# Altium footprint library Active.PcbLib: 325 footprints (part 14 of 23)
Each footprint in its own frame and in the unit in brackets; x right, y up, seen from the top. Pads: shape width x height; smd on the part's side, far side on the other; paste and mask are expansions set on the pad; w line width, h text height; cw(c..) or ccw(c..) is an arc to the next point about the centre after c.
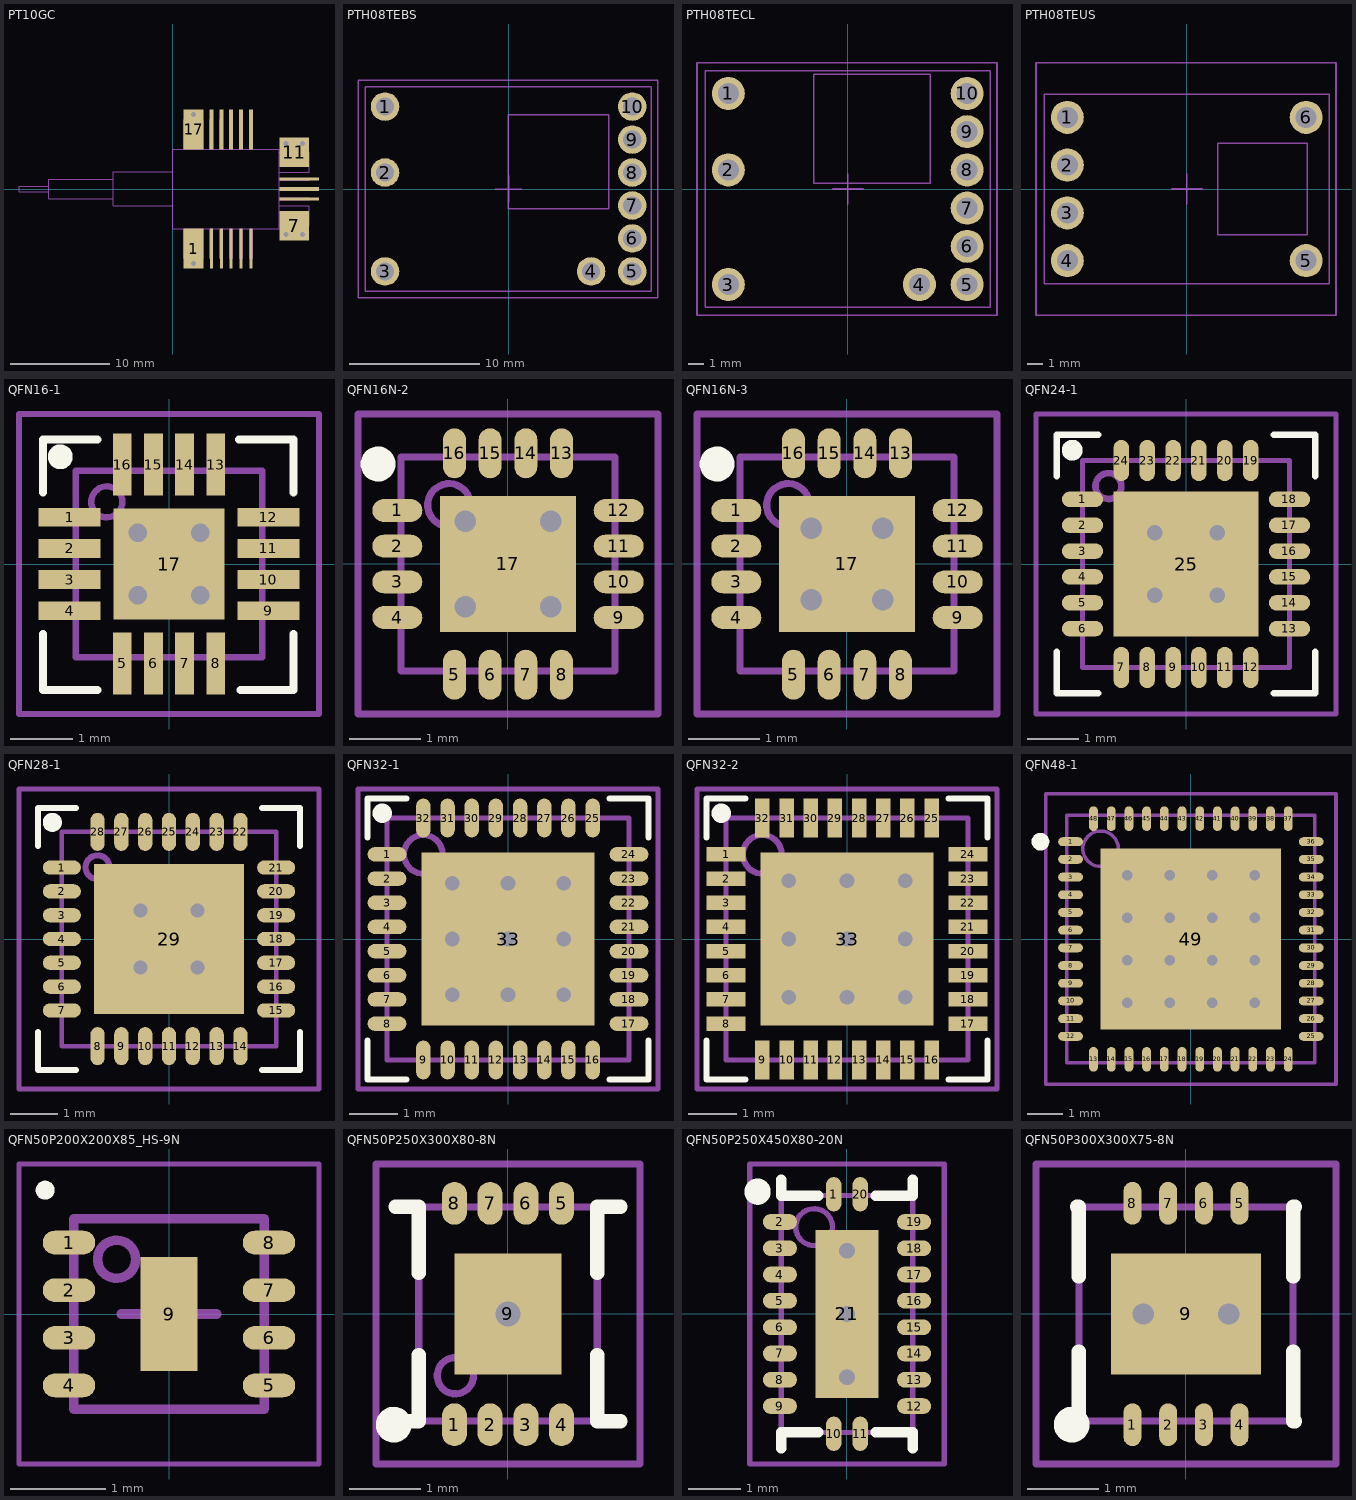
[diagram p13: the footprints below, top view; thin cyan lines are the x and y axes]

## PT10GC [mm] "10Gb/s PIN Preamp Receiver PT10GC"
height 4
pads (17):
  rect 2x4 smd paste-5: 1(2.1,-6) 17(2.1,6)
  rect 0.3x4 smd paste-5: 2(3.9,-6) 3(4.9,-6) 4(5.9,-6) 5(6.9,-6) 6(7.9,-6)
  rect 3x3 smd paste-5: 7(12.25,-3.7) 11(12.25,3.7)
  rect 4x0.3 smd paste-5: 8(12.75,-1) 10(12.75,1)
  rect 4x0.4 smd paste-5: 9(12.75,0)
  rect 0.4x4 smd paste-5: 12(7.9,6) 13(6.9,6) 14(5.9,6) 15(4.9,6) 16(3.9,6)
via 2.1,7.5 diameter 1 hole 0.5
via 2.1,-7.5 diameter 1 hole 0.5
via 11.4,4.6 diameter 1 hole 0.5
via 13.1,4.6 diameter 1 hole 0.5
via 13.1,-4.6 diameter 1 hole 0.5
via 11.4,-4.6 diameter 1 hole 0.5
Mechanical 13:
  lines w0.1: -12.5,-0.3 -15.5,-0.3 -15.5,0.3 -12.5,0.3 ; 1.1,-4 1.1,-7 3.1,-7 3.1,-4 ; 1.1,4 1.1,7 3.1,7 3.1,4 ; 3.75,-4 3.75,-7 4.05,-7 4.05,-4 ; 3.75,4 3.75,7 4.05,7 4.05,4 ; 4.75,-4 4.75,-7 5.05,-7 5.05,-4 ; 4.75,4 4.75,7 5.05,7 5.05,4 ; 5.75,-4 5.75,-7 6.05,-7 6.05,-4 ; 5.75,4 5.75,7 6.05,7 6.05,4 ; 6.75,-4 6.75,-7 7.05,-7 7.05,-4 ; 6.75,4 6.75,7 7.05,7 7.05,4 ; 7.75,-4 7.75,-7 8.05,-7 8.05,-4 ; 7.75,4 7.75,7 8.05,7 8.05,4 ; 10.75,-3.7 13.75,-3.7 13.75,-1.7 10.75,-1.7 ; 10.75,-1.1 13.75,-1.1 13.75,-0.9 10.75,-0.9 ; 10.75,-0.15 13.75,-0.15 13.75,0.15 10.75,0.15 ; 10.75,0.9 13.75,0.9 13.75,1.1 10.75,1.1 ; 10.75,1.7 13.75,1.7 13.75,3.7 10.75,3.7
  lines w0.102: -6,-0.996 -12.5,-0.996 -12.5,0.996 -6,0.996 ; -0.057,1.743 -6,1.743 -6,-1.7 0,-1.7 ; 0,-4 10.75,-4 10.75,4 0,4 0,-4
3D body: height 4, standoff 0.25, extent 0,-4 10.75,4
3D body: height 3.55, standoff 0.05, extent -6,-1.743 0,1.743
3D body: height 2.8, standoff 0.8, extent -12.5,-0.996 -6,0.996
3D body: height 2.1, standoff 1.5, extent -15.5,-0.299 -12.5,0.299
3D body: height 0.25, standoff 0, extent 0,-7 13.75,7
3D body: height 0.25, standoff 0, extent 3.1,-4 7.75,-3.6
3D body: height 0.25, standoff 0, extent 3.1,3.6 7.75,4
3D body: height 0.2, standoff 0, extent 3.75,-7 4.05,-4
3D body: height 0.2, standoff 0, extent 4.75,-7 5.05,-4
3D body: height 0.2, standoff 0, extent 5.75,-7 6.05,-4
3D body: height 0.2, standoff 0, extent 6.75,-7 7.05,-4
3D body: height 0.2, standoff 0, extent 7.75,-7 8.05,-4
3D body: height 0.2, standoff 0, extent 10.75,-0.15 13.75,0.15
3D body: height 0.2, standoff 0, extent 7.75,4 8.05,7
3D body: height 0.2, standoff 0, extent 6.75,4 7.05,7
3D body: height 0.2, standoff 0, extent 5.75,4 6.05,7
3D body: height 0.2, standoff 0, extent 4.75,4 5.05,7
3D body: height 0.2, standoff 0, extent 3.75,4 4.05,7
3D body: height 0.25, standoff 0, extent 10.35,-1.7 10.75,1.7
3D body: height 0.2, standoff 0, extent 10.75,-1.1 13.75,-0.9
3D body: height 0.2, standoff 0, extent 10.75,0.9 13.75,1.1

## PTH08TEBS [mm] "Power Module 19x16x8.5mm  THT"
height 8.5
pads (10):
  round 2.2 hole 1.4: 1(-9.525,6.35) 2(-9.525,1.27) 3(-9.525,-6.35) 4(6.35,-6.35) 5(9.525,-6.35) 6(9.525,-3.81) 7(9.525,-1.27) 8(9.525,1.27) 9(9.525,3.81) 10(9.525,6.35)
Mechanical 13:
  lines w0.102: -11.049,-7.874 -11.049,7.874 10.998,7.874 10.998,-7.874 -11.049,-7.874 ; -0.051,-1.524 7.696,-1.524 7.696,5.715 -0.051,5.715 -0.051,-1.524
Mechanical 15:
  lines w0.102: -1.016,0 1.016,0 ; 0,-1.016 0,1.016 ; -11.608,-8.382 -11.608,8.382 11.506,8.382 11.506,-8.382 -11.608,-8.382
3D body: height 1.8, standoff -3.55, extent 9.025,5.85 10.025,6.85
3D body: height 1.8, standoff -3.55, extent 9.025,3.31 10.025,4.31
3D body: height 1.8, standoff -3.55, extent 9.025,0.77 10.025,1.77
3D body: height 1.8, standoff -3.55, extent 9.025,-1.77 10.025,-0.77
3D body: height 1.8, standoff -3.55, extent 9.025,-4.31 10.025,-3.31
3D body: height 1.8, standoff -3.55, extent 9.025,-6.85 10.025,-5.85
3D body: height 1.8, standoff -3.55, extent 5.85,-6.85 6.85,-5.85
3D body: height 1.8, standoff -3.55, extent -10.025,-6.85 -9.025,-5.85
3D body: height 1.8, standoff -3.55, extent -10.025,0.77 -9.025,1.77
3D body: height 1.8, standoff -3.55, extent -10.025,5.85 -9.025,6.85
3D body: height 8.5, standoff 6, extent -0.051,-1.524 7.696,5.715
3D body: height 1.8, standoff 0.2, extent -10.719,-7.493 10.744,7.493
3D body: height 3.2, standoff 1.8, extent -11.049,-7.874 10.998,7.874
3D body: height 6, standoff 3.2, extent -10.846,-7.62 10.744,7.62

## PTH08TECL [mm] "Power Module 22x16x8.5mm  THT"
height 8.5
pads (10):
  round 2.2 hole 1.4: 1(-7.95,6.35) 2(-7.95,1.27) 3(-7.95,-6.35) 4(4.75,-6.35) 5(7.925,-6.35) 6(7.925,-3.81) 7(7.925,-1.27) 8(7.925,1.27) 9(7.925,3.81) 10(7.925,6.35)
Mechanical 13:
  lines w0.102: -9.474,-7.874 9.449,-7.874 9.449,7.874 -9.474,7.874 -9.474,-7.874 ; -2.286,0.381 -2.286,7.62 5.461,7.62 5.461,0.381 -2.286,0.381
Mechanical 15:
  lines w0.102: -1.016,0 1.016,0 ; 0,-1.016 0,1.016 ; -10.033,-8.382 9.906,-8.382 9.906,8.382 -10.033,8.382 -10.033,-8.382
3D body: height 6, standoff 3.2, extent -9.271,-7.62 9.144,7.62
3D body: height 3.2, standoff 1.8, extent -9.474,-7.874 9.449,7.874
3D body: height 1.8, standoff 0.2, extent -9.144,-7.493 9.144,7.493
3D body: height 8.5, standoff 6, extent -2.286,0.381 5.461,7.62
3D body: height 1.8, standoff -3.55, extent -8.45,5.85 -7.45,6.85
3D body: height 1.8, standoff -3.55, extent -8.45,0.77 -7.45,1.77
3D body: height 1.8, standoff -3.55, extent -8.45,-6.85 -7.45,-5.85
3D body: height 1.8, standoff -3.55, extent 4.25,-6.85 5.25,-5.85
3D body: height 1.8, standoff -3.55, extent 7.425,-6.85 8.425,-5.85
3D body: height 1.8, standoff -3.55, extent 7.425,-4.31 8.425,-3.31
3D body: height 1.8, standoff -3.55, extent 7.425,-1.77 8.425,-0.77
3D body: height 1.8, standoff -3.55, extent 7.425,0.77 8.425,1.77
3D body: height 1.8, standoff -3.55, extent 7.425,3.31 8.425,4.31
3D body: height 1.8, standoff -3.55, extent 7.425,5.85 8.425,6.85

## PTH08TEUS [mm] "Power Module EUS 19x13x8.5mm  THT"
height 8.5
pads (6):
  round 2.2 hole 1.4: 1(-7.95,4.763) 2(-7.95,1.587) 3(-7.95,-1.587) 4(-7.95,-4.763) 5(7.925,-4.763) 6(7.925,4.763)
Mechanical 13:
  lines w0.102: -9.474,-6.285 9.449,-6.285 9.449,6.285 -9.474,6.285 -9.474,-6.285 ; 2.032,-3.048 2.032,3.048 8.001,3.048 8.001,-3.048 2.032,-3.048
Mechanical 15:
  lines w0.102: -1.016,0 1.016,0 ; 0,-1.016 0,1.016 ; -10.033,-8.382 9.906,-8.382 9.906,8.382 -10.033,8.382 -10.033,-8.382
3D body: height 6, standoff 3.2, extent -9.271,-6.2 9.144,6.2
3D body: height 3.2, standoff 1.8, extent -9.474,-6.285 9.449,6.285
3D body: height 1.8, standoff 0.2, extent -9.144,-6.1 9.144,6.1
3D body: height 8.5, standoff 6, extent 2.032,-3.048 8.001,3.048
3D body: height 0, standoff -3.56, extent 7.421,4.268 8.433,5.282
3D body: height 0, standoff -3.56, extent 7.421,-5.257 8.433,-4.243
3D body: height 0, standoff -3.56, extent -8.454,-5.257 -7.442,-4.243
3D body: height 0, standoff -3.56, extent -8.454,-2.082 -7.442,-1.068
3D body: height 0, standoff -3.56, extent -8.454,1.093 -7.442,2.107
3D body: height 0, standoff -3.56, extent -8.454,4.268 -7.442,5.282

## QFN16-1 [mm] "QFN16; 16 Leads; Body Width 3.0 mm; Pitch 0.5 mm"
height 0.9
pads (17):
  rect 1x0.3 smd mask+0.051: 1(-1.6,0.75) 2(-1.6,0.25) 3(-1.6,-0.25) 4(-1.6,-0.75) 9(1.6,-0.75) 10(1.6,-0.25) 11(1.6,0.25) 12(1.6,0.75)
  rect 0.3x1 smd mask+0.051: 5(-0.75,-1.6) 6(-0.25,-1.6) 7(0.25,-1.6) 8(0.75,-1.6) 13(0.75,1.6) 14(0.25,1.6) 15(-0.25,1.6) 16(-0.75,1.6)
  rect 1.778x1.778 smd paste-5 mask-5: 17(0,0)
via -0.5,0.5 diameter 0.65 hole 0.3
via 0.5,0.5 diameter 0.65 hole 0.3
via 0.5,-0.5 diameter 0.65 hole 0.3
via -0.5,-0.5 diameter 0.65 hole 0.3
Top Overlay:
  circle w0.2: c-1.75,1.725 r0.1
  lines w0.127: -2.025,-1.125 -2.025,-2.025 -1.15,-2.025 ; -2.025,1.15 -2.025,2 -1.15,2 ; 1.125,2 2,2 2,1.15 ; 1.15,-2.025 2,-2.025 2,-1.125
Top Paste:
  region: -0.35,0.175 -0.175,0.35 -0.175,0.875 0.175,0.875 0.175,0.35 0.35,0.175 0.875,0.175 0.875,-0.175 0.35,-0.175 0.175,-0.35 0.175,-0.875 -0.175,-0.875 -0.175,-0.35 -0.35,-0.175 -0.875,-0.175 -0.875,0.175
Top Solder:
  region: -0.925,0.925 -0.5,0.925 -0.5,0.825 -0.532,0.825 -0.627,0.806 -0.734,0.734 -0.806,0.627 -0.825,0.532 -0.825,0.5 -0.825,0.468 -0.806,0.373 -0.734,0.266 -0.627,0.194 -0.532,0.175 -0.5,0.175 -0.468,0.175 -0.373,0.194 -0.266,0.266 -0.194,0.373 -0.175,0.468 -0.175,0.5 -0.175,0.532 -0.194,0.627 -0.266,0.734 -0.373,0.806 -0.468,0.825 -0.5,0.825 -0.5,0.925 0,0.925 0,0 -0.925,0
  region: -0.925,-0.925 -0.925,-0.5 -0.825,-0.5 -0.825,-0.532 -0.806,-0.627 -0.734,-0.734 -0.627,-0.806 -0.532,-0.825 -0.5,-0.825 -0.468,-0.825 -0.373,-0.806 -0.266,-0.734 -0.194,-0.627 -0.175,-0.532 -0.175,-0.5 -0.175,-0.468 -0.194,-0.373 -0.266,-0.266 -0.373,-0.194 -0.468,-0.175 -0.5,-0.175 -0.532,-0.175 -0.627,-0.194 -0.734,-0.266 -0.806,-0.373 -0.825,-0.468 -0.825,-0.5 -0.925,-0.5 -0.925,0 0,0 0,-0.925
  region: 0.925,-0.925 0.5,-0.925 0.5,-0.825 0.532,-0.825 0.627,-0.806 0.734,-0.734 0.806,-0.627 0.825,-0.532 0.825,-0.5 0.825,-0.468 0.806,-0.373 0.734,-0.266 0.627,-0.194 0.532,-0.175 0.5,-0.175 0.468,-0.175 0.373,-0.194 0.266,-0.266 0.194,-0.373 0.175,-0.468 0.175,-0.5 0.175,-0.532 0.194,-0.627 0.266,-0.734 0.373,-0.806 0.468,-0.825 0.5,-0.825 0.5,-0.925 0,-0.925 0,0 0.925,0
  region: 0.925,0.925 0.925,0.5 0.825,0.5 0.825,0.532 0.806,0.627 0.734,0.734 0.627,0.806 0.532,0.825 0.5,0.825 0.468,0.825 0.373,0.806 0.266,0.734 0.194,0.627 0.175,0.532 0.175,0.5 0.175,0.468 0.194,0.373 0.266,0.266 0.373,0.194 0.468,0.175 0.5,0.175 0.532,0.175 0.627,0.194 0.734,0.266 0.806,0.373 0.825,0.468 0.825,0.5 0.925,0.5 0.925,0 0,0 0,0.925
Mechanical 13:
  circle w0.102: c-1,1 r0.25
  lines w0.1: -1.5,-1.5 1.5,-1.5 1.5,1.5 -1.5,1.5 -1.5,-1.5
Mechanical 15:
  lines w0.1: -2.413,-2.413 2.413,-2.413 2.413,2.413 -2.413,2.413 -2.413,-2.413
  lines w0.102: -0.508,0 0.508,0 ; 0,-0.508 0,0.508
3D body: height 0.9, standoff 0, extent -1.5,-1.5 1.5,1.5

## QFN16N-2 [mm] "QFN, 16-Leads, Body 3,0x3,0mm (max), Pitch 0,50mm, IPC Medium Density"
height 1
pads (17):
  oval 0.7x0.32 smd mask+0.051: 1(-1.55,0.75) 2(-1.55,0.25) 3(-1.55,-0.25) 4(-1.55,-0.75) 9(1.55,-0.75) 10(1.55,-0.25) 11(1.55,0.25) 12(1.55,0.75)
  oval 0.32x0.7 smd mask+0.051: 5(-0.75,-1.55) 6(-0.25,-1.55) 7(0.25,-1.55) 8(0.75,-1.55) 13(0.75,1.55) 14(0.25,1.55) 15(-0.25,1.55) 16(-0.75,1.55)
  rect 1.9x1.9 smd paste-5 mask-5: 17(0,0)
via 0.6,-0.6 diameter 0.66 hole 0.3
via -0.6,-0.6 diameter 0.66 hole 0.3
via 0.6,0.6 diameter 0.66 hole 0.3
via -0.6,0.6 diameter 0.66 hole 0.3
Top Overlay:
  circle w0.25: c-1.82,1.4 r0.12
Top Paste:
  region: -0.275,0.95 -0.275,0.45 -0.45,0.275 -0.95,0.275 -0.95,-0.275 -0.45,-0.275 -0.275,-0.45 -0.275,-0.95 0.275,-0.95 0.275,-0.45 0.45,-0.275 0.95,-0.275 0.95,0.275 0.45,0.275 0.275,0.45 0.275,0.95
Top Solder:
  region: 1,1 1,0.6 0.925,0.6 0.925,0.632 0.906,0.727 0.834,0.834 0.727,0.906 0.632,0.925 0.6,0.925 0.568,0.925 0.473,0.906 0.366,0.834 0.294,0.727 0.275,0.632 0.275,0.6 0.275,0.568 0.294,0.473 0.366,0.366 0.473,0.294 0.568,0.275 0.6,0.275 0.632,0.275 0.727,0.294 0.834,0.366 0.906,0.473 0.925,0.568 0.925,0.6 1,0.6 1,0 0,0 0,1
  region: 1,-1 0.6,-1 0.6,-0.925 0.632,-0.925 0.727,-0.906 0.834,-0.834 0.906,-0.727 0.925,-0.632 0.925,-0.6 0.925,-0.568 0.906,-0.473 0.834,-0.366 0.727,-0.294 0.632,-0.275 0.6,-0.275 0.568,-0.275 0.473,-0.294 0.366,-0.366 0.294,-0.473 0.275,-0.568 0.275,-0.6 0.275,-0.632 0.294,-0.727 0.366,-0.834 0.473,-0.906 0.568,-0.925 0.6,-0.925 0.6,-1 0,-1 0,0 1,0
  region: -1,-1 -1,-0.6 -0.925,-0.6 -0.925,-0.632 -0.906,-0.727 -0.834,-0.834 -0.727,-0.906 -0.632,-0.925 -0.6,-0.925 -0.568,-0.925 -0.473,-0.906 -0.366,-0.834 -0.294,-0.727 -0.275,-0.632 -0.275,-0.6 -0.275,-0.568 -0.294,-0.473 -0.366,-0.366 -0.473,-0.294 -0.568,-0.275 -0.6,-0.275 -0.632,-0.275 -0.727,-0.294 -0.834,-0.366 -0.906,-0.473 -0.925,-0.568 -0.925,-0.6 -1,-0.6 -1,0 0,0 0,-1
  region: -1,1 -0.6,1 -0.6,0.925 -0.632,0.925 -0.727,0.906 -0.834,0.834 -0.906,0.727 -0.925,0.632 -0.925,0.6 -0.925,0.568 -0.906,0.473 -0.834,0.366 -0.727,0.294 -0.632,0.275 -0.6,0.275 -0.568,0.275 -0.473,0.294 -0.366,0.366 -0.294,0.473 -0.275,0.568 -0.275,0.6 -0.275,0.632 -0.294,0.727 -0.366,0.834 -0.473,0.906 -0.568,0.925 -0.6,0.925 -0.6,1 0,1 0,0 -1,0
Mechanical 13:
  circle w0.1: c-0.825,0.825 r0.3
  lines w0.1: -1.5,-1.5 1.5,-1.5 1.5,1.5 -1.5,1.5 -1.5,-1.5
Mechanical 15:
  lines w0.1: -0.5,0 0.5,0 ; 0,-0.5 0,0.5 ; -2.1,-2.1 2.1,-2.1 2.1,2.1 -2.1,2.1 -2.1,-2.1
3D body: height 1, standoff 0.02, extent -1.5,-1.5 1.5,1.5
3D body: height 1.01, standoff 1, extent -1.225,0.425 -0.425,1.225

## QFN16N-3 [mm] "QFN, 16-Leads, Body 3,0x3,0mm (max), Pitch 0,50mm, IPC Medium Density"
height 1
pads (17):
  oval 0.7x0.32 smd mask+0.051: 1(-1.55,0.75) 2(-1.55,0.25) 3(-1.55,-0.25) 4(-1.55,-0.75) 9(1.55,-0.75) 10(1.55,-0.25) 11(1.55,0.25) 12(1.55,0.75)
  oval 0.32x0.7 smd mask+0.051: 5(-0.75,-1.55) 6(-0.25,-1.55) 7(0.25,-1.55) 8(0.75,-1.55) 13(0.75,1.55) 14(0.25,1.55) 15(-0.25,1.55) 16(-0.75,1.55)
  rect 1.9x1.9 smd paste-5 mask-5: 17(0,0)
via -0.5,0.5 diameter 0.65 hole 0.3
via -0.5,-0.5 diameter 0.65 hole 0.3
via 0.5,-0.5 diameter 0.65 hole 0.3
via 0.5,0.5 diameter 0.65 hole 0.3
Top Overlay:
  circle w0.25: c-1.82,1.4 r0.12
Top Paste:
  region: 0.65,-0.95 0.65,-0.825 0.825,-0.65 0.95,-0.65 0.95,-0.95
  region: 0.95,0.65 0.825,0.65 0.65,0.825 0.65,0.95 0.95,0.95
  region: -0.65,0.95 -0.65,0.825 -0.825,0.65 -0.95,0.65 -0.95,0.95
  region: -0.95,-0.65 -0.825,-0.65 -0.65,-0.825 -0.65,-0.95 -0.95,-0.95
  region: 0.175,-0.65 0.35,-0.825 0.35,-0.95 -0.35,-0.95 -0.35,-0.825 -0.175,-0.65
  region: -0.65,-0.175 -0.825,-0.35 -0.95,-0.35 -0.95,0.35 -0.825,0.35 -0.65,0.175
  region: -0.175,0.65 -0.35,0.825 -0.35,0.95 0.35,0.95 0.35,0.825 0.175,0.65
  region: 0.65,0.175 0.825,0.35 0.95,0.35 0.95,-0.35 0.825,-0.35 0.65,-0.175
  region: -0.175,0.35 0.175,0.35 0.35,0.175 0.35,-0.175 0.175,-0.35 -0.175,-0.35 -0.35,-0.175 -0.35,0.175
Top Solder:
  region: -0.975,0.975 -0.5,0.975 -0.5,0.825 -0.532,0.825 -0.627,0.806 -0.734,0.734 -0.806,0.627 -0.825,0.532 -0.825,0.5 -0.825,0.468 -0.806,0.373 -0.734,0.266 -0.627,0.194 -0.532,0.175 -0.5,0.175 -0.5,-0.175 -0.532,-0.175 -0.627,-0.194 -0.734,-0.266 -0.806,-0.373 -0.825,-0.468 -0.825,-0.5 -0.825,-0.532 -0.806,-0.627 -0.734,-0.734 -0.627,-0.806 -0.532,-0.825 -0.5,-0.825 -0.468,-0.825 -0.373,-0.806 -0.266,-0.734 -0.194,-0.627 -0.175,-0.532 -0.175,-0.5 0.175,-0.5 0.175,-0.532 0.194,-0.627 0.266,-0.734 0.373,-0.806 0.468,-0.825 0.5,-0.825 0.532,-0.825 0.627,-0.806 0.734,-0.734 0.806,-0.627 0.825,-0.532 0.825,-0.5 0.825,-0.468 0.806,-0.373 0.734,-0.266 0.627,-0.194 0.532,-0.175 0.5,-0.175 0.5,0.175 0.532,0.175 0.627,0.194 0.734,0.266 0.806,0.373 0.825,0.468 0.825,0.5 0.825,0.532 0.806,0.627 0.734,0.734 0.627,0.806 0.532,0.825 0.5,0.825 0.468,0.825 0.373,0.806 0.266,0.734 0.194,0.627 0.175,0.532 0.175,0.5 0.175,0.468 0.194,0.373 0.266,0.266 0.373,0.194 0.468,0.175 0.5,0.175 0.5,-0.175 0.468,-0.175 0.373,-0.194 0.266,-0.266 0.194,-0.373 0.175,-0.468 0.175,-0.5 -0.175,-0.5 -0.175,-0.468 -0.194,-0.373 -0.266,-0.266 -0.373,-0.194 -0.468,-0.175 -0.5,-0.175 -0.5,0.175 -0.468,0.175 -0.373,0.194 -0.266,0.266 -0.194,0.373 -0.175,0.468 -0.175,0.5 -0.175,0.532 -0.194,0.627 -0.266,0.734 -0.373,0.806 -0.468,0.825 -0.5,0.825 -0.5,0.975 0.975,0.975 0.975,-0.975 -0.975,-0.975
Mechanical 13:
  circle w0.1: c-0.825,0.825 r0.3
  lines w0.1: -1.5,-1.5 -1.5,1.5 1.5,1.5 1.5,-1.5 -1.5,-1.5
Mechanical 15:
  lines w0.1: -0.5,0 0.5,0 ; 0,-0.5 0,0.5 ; -2.1,-2.1 -2.1,2.1 2.1,2.1 2.1,-2.1 -2.1,-2.1
3D body: height 1, standoff 0.02, extent -1.5,-1.5 1.5,1.5
3D body: height 1.01, standoff 1, extent -1.225,0.425 -0.425,1.225

## QFN24-1 [mm] "QFN24; 24 Leads; Body Width 4.0 mm; Pitch 0.5 mm"
height 0.9
pads (25):
  oval 0.8x0.3 smd mask+0.025: 1(-2,1.25) 2(-2,0.75) 3(-2,0.25) 4(-2,-0.25) 5(-2,-0.75) 6(-2,-1.25) 13(2,-1.25) 14(2,-0.75) 15(2,-0.25) 16(2,0.25) 17(2,0.75) 18(2,1.25)
  oval 0.3x0.8 smd mask+0.025: 7(-1.25,-2) 8(-0.75,-2) 9(-0.25,-2) 10(0.25,-2) 11(0.75,-2) 12(1.25,-2) 19(1.25,2) 20(0.75,2) 21(0.25,2) 22(-0.25,2) 23(-0.75,2) 24(-1.25,2)
  rect 2.8x2.8 smd paste-2.54 mask-2.54: 25(0,0)
via -0.6,-0.6 diameter 0.6 hole 0.3
via -0.6,0.6 diameter 0.6 hole 0.3
via 0.6,0.6 diameter 0.6 hole 0.3
via 0.6,-0.6 diameter 0.6 hole 0.3
Top Overlay:
  circle w0.2: c-2.2,2.2 r0.1
  lines w0.127: -2.5,-1.7 -2.5,-2.5 -1.7,-2.5 ; -2.5,1.7 -2.5,2.5 -1.7,2.5 ; 1.7,-2.5 2.5,-2.5 2.5,-1.7 ; 1.7,2.5 2.5,2.5 2.5,1.7
Top Paste:
  region: -0.45,1.3 -0.45,0.95 -0.25,0.75 0.25,0.75 0.45,0.95 0.45,1.3
  region: 1.3,0.45 0.95,0.45 0.75,0.25 0.75,-0.25 0.95,-0.45 1.3,-0.45
  region: -1.3,1.3 -0.725,1.3 -0.725,0.975 -0.95,0.75 -1.3,0.75
  region: 1.3,-1.3 0.725,-1.3 0.725,-0.975 0.95,-0.75 1.3,-0.75
  region: 1.3,1.3 1.3,0.725 0.975,0.725 0.75,0.95 0.75,1.3
  region: 0.45,-1.3 0.45,-0.95 0.25,-0.75 -0.25,-0.75 -0.45,-0.95 -0.45,-1.3
  region: -1.3,-0.45 -0.95,-0.45 -0.75,-0.25 -0.75,0.25 -0.95,0.45 -1.3,0.45
  region: -0.45,-0.25 -0.25,-0.45 0.25,-0.45 0.45,-0.25 0.45,0.25 0.25,0.45 -0.25,0.45 -0.45,0.25
  region: -1.3,-1.3 -1.3,-0.725 -0.975,-0.725 -0.75,-0.95 -0.75,-1.3
Top Solder:
  region: -1.4,1.4 -0.6,1.4 -0.6,0.9 -0.63,0.9 -0.717,0.883 -0.816,0.816 -0.883,0.717 -0.9,0.63 -0.9,0.6 -0.9,0.57 -0.883,0.483 -0.816,0.384 -0.717,0.317 -0.63,0.3 -0.6,0.3 -0.57,0.3 -0.483,0.317 -0.384,0.384 -0.317,0.483 -0.3,0.57 -0.3,0.6 -0.3,0.63 -0.317,0.717 -0.384,0.816 -0.483,0.883 -0.57,0.9 -0.6,0.9 -0.6,1.4 0.6,1.4 0.6,0.9 0.57,0.9 0.483,0.883 0.384,0.816 0.317,0.717 0.3,0.63 0.3,0.6 0.3,0.57 0.317,0.483 0.384,0.384 0.483,0.317 0.57,0.3 0.6,0.3 0.63,0.3 0.717,0.317 0.816,0.384 0.883,0.483 0.9,0.57 0.9,0.6 0.9,0.63 0.883,0.717 0.816,0.816 0.717,0.883 0.63,0.9 0.6,0.9 0.6,1.4 1.4,1.4 1.4,-0.6 0.9,-0.6 0.9,-0.57 0.883,-0.483 0.816,-0.384 0.717,-0.317 0.63,-0.3 0.6,-0.3 0.57,-0.3 0.483,-0.317 0.384,-0.384 0.317,-0.483 0.3,-0.57 0.3,-0.6 0.3,-0.63 0.317,-0.717 0.384,-0.816 0.483,-0.883 0.57,-0.9 0.6,-0.9 0.63,-0.9 0.717,-0.883 0.816,-0.816 0.883,-0.717 0.9,-0.63 0.9,-0.6 1.4,-0.6 1.4,-1.4 -0.6,-1.4 -0.6,-0.9 -0.57,-0.9 -0.483,-0.883 -0.384,-0.816 -0.317,-0.717 -0.3,-0.63 -0.3,-0.6 -0.3,-0.57 -0.317,-0.483 -0.384,-0.384 -0.483,-0.317 -0.57,-0.3 -0.6,-0.3 -0.63,-0.3 -0.717,-0.317 -0.816,-0.384 -0.883,-0.483 -0.9,-0.57 -0.9,-0.6 -0.9,-0.63 -0.883,-0.717 -0.816,-0.816 -0.717,-0.883 -0.63,-0.9 -0.6,-0.9 -0.6,-1.4 -1.4,-1.4
Mechanical 13:
  circle w0.127: c-1.5,1.506 r0.25
  lines w0.1: -2,-2 -2,2 2,2 2,-2 -2,-2
Mechanical 15:
  lines w0.102: -1.016,0 1.016,0 ; 0,-1.016 0,1.016 ; -2.9,-2.9 2.9,-2.9 2.9,2.9 -2.9,2.9 -2.9,-2.9
3D body: height 0.9, standoff 0, extent -2,-2 2,2
3D body: height 0.9, standoff 0.9, extent -1.753,1.245 -1.25,1.753

## QFN28-1 [mm] "QFN28; 28 Leads; Body Width 5.0 mm; Pitch 0.5 mm"
height 0.9
pads (29):
  oval 0.8x0.3 smd mask+0.038: 1(-2.25,1.5) 2(-2.25,1) 3(-2.25,0.5) 4(-2.25,0) 5(-2.25,-0.5) 6(-2.25,-1) 7(-2.25,-1.5) 15(2.25,-1.5) 16(2.25,-1) 17(2.25,-0.5) 18(2.25,0) 19(2.25,0.5) 20(2.25,1) 21(2.25,1.5)
  oval 0.3x0.8 smd mask+0.038: 8(-1.5,-2.25) 9(-1,-2.25) 10(-0.5,-2.25) 11(0,-2.25) 12(0.5,-2.25) 13(1,-2.25) 14(1.5,-2.25) 22(1.5,2.25) 23(1,2.25) 24(0.5,2.25) 25(0,2.25) 26(-0.5,2.25) 27(-1,2.25) 28(-1.5,2.25)
  rect 3.15x3.15 smd paste-1.6 mask-1.6: 29(0,0)
via 0.6,-0.6 diameter 0.65 hole 0.3
via 0.6,0.6 diameter 0.65 hole 0.3
via -0.6,-0.6 diameter 0.65 hole 0.3
via -0.6,0.6 diameter 0.65 hole 0.3
Top Overlay:
  circle w0.2: c-2.45,2.45 r0.1
  lines w0.127: -2.75,-1.95 -2.75,-2.75 -1.95,-2.75 ; -2.75,1.95 -2.75,2.75 -1.95,2.75 ; 1.95,-2.75 2.75,-2.75 2.75,-1.95 ; 1.95,2.75 2.75,2.75 2.75,1.95
Top Paste:
  region: -0.2,0.45 -0.45,0.2 -0.45,-0.2 -0.2,-0.45 0.2,-0.45 0.45,-0.2 0.45,0.2 0.2,0.45
  region: 0.45,1.475 -0.45,1.475 -0.45,1 -0.2,0.75 0.2,0.75 0.45,1
  region: 1.475,-0.45 1.475,0.45 1,0.45 0.75,0.2 0.75,-0.2 1,-0.45
  region: -1.475,0.45 -1.475,-0.45 -1,-0.45 -0.75,-0.2 -0.75,0.2 -1,0.45
  region: -0.45,-1.475 0.45,-1.475 0.45,-1 0.2,-0.75 -0.2,-0.75 -0.45,-1
  region: -1.475,-0.75 -1.475,-1.475 -0.75,-1.475 -0.75,-1 -1,-0.75
  region: 0.75,-1.475 1.475,-1.475 1.475,-0.75 1,-0.75 0.75,-1
  region: 1.475,0.75 1.475,1.475 0.75,1.475 0.75,1 1,0.75
  region: -0.75,1.475 -1.475,1.475 -1.475,0.75 -1,0.75 -0.75,1
Top Solder:
  region: 1.6,1.6 1.6,0.6 0.9,0.6 0.9,0.63 0.883,0.717 0.816,0.816 0.717,0.883 0.63,0.9 0.6,0.9 0.57,0.9 0.483,0.883 0.384,0.816 0.317,0.717 0.3,0.63 0.3,0.6 0.3,0.57 0.317,0.483 0.384,0.384 0.483,0.317 0.57,0.3 0.6,0.3 0.63,0.3 0.717,0.317 0.816,0.384 0.883,0.483 0.9,0.57 0.9,0.6 1.6,0.6 1.6,-0.6 0.9,-0.6 0.9,-0.57 0.883,-0.483 0.816,-0.384 0.717,-0.317 0.63,-0.3 0.6,-0.3 0.57,-0.3 0.483,-0.317 0.384,-0.384 0.317,-0.483 0.3,-0.57 0.3,-0.6 0.3,-0.63 0.317,-0.717 0.384,-0.816 0.483,-0.883 0.57,-0.9 0.6,-0.9 0.63,-0.9 0.717,-0.883 0.816,-0.816 0.883,-0.717 0.9,-0.63 0.9,-0.6 1.6,-0.6 1.6,-1.6 -1.6,-1.6 -1.6,-0.6 -0.9,-0.6 -0.9,-0.63 -0.883,-0.717 -0.816,-0.816 -0.717,-0.883 -0.63,-0.9 -0.6,-0.9 -0.57,-0.9 -0.483,-0.883 -0.384,-0.816 -0.317,-0.717 -0.3,-0.63 -0.3,-0.6 -0.3,-0.57 -0.317,-0.483 -0.384,-0.384 -0.483,-0.317 -0.57,-0.3 -0.6,-0.3 -0.63,-0.3 -0.717,-0.317 -0.816,-0.384 -0.883,-0.483 -0.9,-0.57 -0.9,-0.6 -1.6,-0.6 -1.6,0.6 -0.9,0.6 -0.9,0.57 -0.883,0.483 -0.816,0.384 -0.717,0.317 -0.63,0.3 -0.6,0.3 -0.57,0.3 -0.483,0.317 -0.384,0.384 -0.317,0.483 -0.3,0.57 -0.3,0.6 -0.3,0.63 -0.317,0.717 -0.384,0.816 -0.483,0.883 -0.57,0.9 -0.6,0.9 -0.63,0.9 -0.717,0.883 -0.816,0.816 -0.883,0.717 -0.9,0.63 -0.9,0.6 -1.6,0.6 -1.6,1.6
Mechanical 13:
  circle w0.127: c-1.5,1.506 r0.25
  lines w0.1: -2.25,-2.25 2.25,-2.25 2.25,2.25 -2.25,2.25 -2.25,-2.25
Mechanical 15:
  lines w0.102: -1.016,0 1.016,0 ; 0,-1.016 0,1.016 ; -3.15,-3.15 -3.15,3.15 3.15,3.15 3.15,-3.15 -3.15,-3.15
3D body: height 0.9, standoff 0.9, extent -1.753,1.245 -1.25,1.753
3D body: height 0.9, standoff 0, extent -2,-2 2,2

## QFN32-1 [mm] "QFN32  W32pin 5.0x5.0mm H0.9mm R0.5 mm PP3.5x3.5mm"
height 0.9
pads (33):
  oval 0.8x0.3 smd mask+0.038: 1(-2.5,1.75) 2(-2.5,1.25) 3(-2.5,0.75) 4(-2.5,0.25) 5(-2.5,-0.25) 6(-2.5,-0.75) 7(-2.5,-1.25) 8(-2.5,-1.75) 17(2.5,-1.75) 18(2.5,-1.25) 19(2.5,-0.75) 20(2.5,-0.25) 21(2.5,0.25) 22(2.5,0.75) 23(2.5,1.25) 24(2.5,1.75)
  oval 0.3x0.8 smd mask+0.038: 9(-1.75,-2.5) 10(-1.25,-2.5) 11(-0.75,-2.5) 12(-0.25,-2.5) 13(0.25,-2.5) 14(0.75,-2.5) 15(1.25,-2.5) 16(1.75,-2.5) 25(1.75,2.5) 26(1.25,2.5) 27(0.75,2.5) 28(0.25,2.5) 29(-0.25,2.5) 30(-0.75,2.5) 31(-1.25,2.5) 32(-1.75,2.5)
  rect 3.58x3.58 smd paste-5 mask-5: 33(0,0)
via -1.15,1.15 diameter 0.6 hole 0.3
via 0,1.15 diameter 0.6 hole 0.3
via 1.15,1.15 diameter 0.6 hole 0.3
via 1.15,-1.15 diameter 0.6 hole 0.3
via -1.15,-1.15 diameter 0.6 hole 0.3
via 0,-1.15 diameter 0.6 hole 0.3
via 1.15,0 diameter 0.6 hole 0.3
via -1.15,0 diameter 0.6 hole 0.3
via 0,0 diameter 0.6 hole 0.3
Top Overlay:
  circle w0.2: c-2.6,2.6 r0.1
  lines w0.127: -2.9,-2.1 -2.9,-2.9 -2.1,-2.9 ; -2.9,2.1 -2.9,2.9 -2.1,2.9 ; 2.1,-2.9 2.9,-2.9 2.9,-2.1 ; 2.1,2.9 2.9,2.9 2.9,2.1
Top Paste:
  region: -1,0.85 -0.85,1 -0.3,1 -0.15,0.85 -0.15,0.3 -0.3,0.15 -0.85,0.15 -1,0.3
  region: -0.85,-1 -1,-0.85 -1,-0.3 -0.85,-0.15 -0.3,-0.15 -0.15,-0.3 -0.15,-0.85 -0.3,-1
  region: 1,-0.85 0.85,-1 0.3,-1 0.15,-0.85 0.15,-0.3 0.3,-0.15 0.85,-0.15 1,-0.3
  region: 0.85,1 1,0.85 1,0.3 0.85,0.15 0.3,0.15 0.15,0.3 0.15,0.85 0.3,1
  region: -1.75,1 -1.45,1 -1.3,0.85 -1.3,0.3 -1.45,0.15 -1.75,0.15
  region: -1.75,-0.15 -1.45,-0.15 -1.3,-0.3 -1.3,-0.85 -1.45,-1 -1.75,-1
  region: -1,-1.75 -1,-1.45 -0.85,-1.3 -0.3,-1.3 -0.15,-1.45 -0.15,-1.75
  region: 0.15,-1.75 0.15,-1.45 0.3,-1.3 0.85,-1.3 1,-1.45 1,-1.75
  region: 1.75,-1 1.45,-1 1.3,-0.85 1.3,-0.3 1.45,-0.15 1.75,-0.15
  region: 1.75,0.15 1.45,0.15 1.3,0.3 1.3,0.85 1.45,1 1.75,1
  region: 1,1.75 1,1.45 0.85,1.3 0.3,1.3 0.15,1.45 0.15,1.75
  region: -0.15,1.75 -0.15,1.45 -0.3,1.3 -0.85,1.3 -1,1.45 -1,1.75
  region: 1.75,1.75 1.75,1.3 1.45,1.3 1.3,1.45 1.3,1.75
  region: -1.75,1.75 -1.3,1.75 -1.3,1.45 -1.45,1.3 -1.75,1.3
  region: -1.75,-1.75 -1.75,-1.3 -1.45,-1.3 -1.3,-1.45 -1.3,-1.75
  region: 1.75,-1.75 1.3,-1.75 1.3,-1.45 1.45,-1.3 1.75,-1.3
Top Solder:
  drawing of 2 lines, arcs and shapes, not listed
Mechanical 13:
  circle w0.127: c-1.75,1.75 r0.4
  lines w0.1: -2.5,-2.5 -2.5,2.5 2.5,2.5 2.5,-2.5 -2.5,-2.5
Mechanical 15:
  lines w0.102: -1.016,0 1.016,0 ; 0,-1.016 0,1.016 ; -3.1,-3.1 3.1,-3.1 3.1,3.1 -3.1,3.1 -3.1,-3.1
3D body: height 0.91, standoff 0.9, extent -2.15,1.35 -1.35,2.15
3D body: height 0.9, standoff 0, extent -2.5,-2.5 2.5,2.5

## QFN32-2 [mm] "QFN32  W32pin 5.0x5.0mm H0.75mm R0.5 mm PP3.5x3.5mm"
height 0.75
pads (33):
  rect 0.8x0.3 smd paste+0 mask+0.038: 1(-2.5,1.75) 2(-2.5,1.25) 3(-2.5,0.75) 4(-2.5,0.25) 5(-2.5,-0.25) 6(-2.5,-0.75) 7(-2.5,-1.25) 8(-2.5,-1.75) 17(2.5,-1.75) 18(2.5,-1.25) 19(2.5,-0.75) 20(2.5,-0.25) 21(2.5,0.25) 22(2.5,0.75) 23(2.5,1.25) 24(2.5,1.75)
  rect 0.3x0.8 smd paste+0 mask+0.038: 9(-1.75,-2.5) 10(-1.25,-2.5) 11(-0.75,-2.5) 12(-0.25,-2.5) 13(0.25,-2.5) 14(0.75,-2.5) 15(1.25,-2.5) 16(1.75,-2.5) 25(1.75,2.5) 26(1.25,2.5) 27(0.75,2.5) 28(0.25,2.5) 29(-0.25,2.5) 30(-0.75,2.5) 31(-1.25,2.5) 32(-1.75,2.5)
  rect 3.58x3.58 smd paste-1.803 mask-1.803: 33(0,0)
via -1.2,1.2 diameter 0.65 hole 0.3
via -1.2,-1.2 diameter 0.65 hole 0.3
via 1.2,-1.2 diameter 0.65 hole 0.3
via 0,-1.2 diameter 0.65 hole 0.3
via -1.2,0 diameter 0.65 hole 0.3
via 1.2,0 diameter 0.65 hole 0.3
via 1.2,1.2 diameter 0.65 hole 0.3
via 0,0 diameter 0.65 hole 0.3
via 0,1.2 diameter 0.65 hole 0.3
Top Overlay:
  circle w0.2: c-2.6,2.6 r0.1
  lines w0.127: -2.9,-2.1 -2.9,-2.9 -2.1,-2.9 ; -2.9,2.1 -2.9,2.9 -2.1,2.9 ; 2.1,-2.9 2.9,-2.9 2.9,-2.1 ; 2.1,2.9 2.9,2.9 2.9,2.1
Top Paste:
  region: -1.7,-1.35 -1.7,-1.7 -1.35,-1.7 -1.35,-1.6 -1.6,-1.35
  region: -1.35,1.7 -1.7,1.7 -1.7,1.35 -1.6,1.35 -1.35,1.6
  region: 1.7,1.35 1.7,1.7 1.35,1.7 1.35,1.6 1.6,1.35
  region: 1.35,-1.7 1.7,-1.7 1.7,-1.35 1.6,-1.35 1.35,-1.6
  region: -1.35,-0.4 -1.6,-0.15 -1.7,-0.15 -1.7,-1.05 -1.6,-1.05 -1.35,-0.8
  region: -1.35,0.8 -1.6,1.05 -1.7,1.05 -1.7,0.15 -1.6,0.15 -1.35,0.4
  region: -0.4,1.35 -0.15,1.6 -0.15,1.7 -1.05,1.7 -1.05,1.6 -0.8,1.35
  region: 0.8,1.35 1.05,1.6 1.05,1.7 0.15,1.7 0.15,1.6 0.4,1.35
  region: 1.35,-0.8 1.6,-1.05 1.7,-1.05 1.7,-0.15 1.6,-0.15 1.35,-0.4
  region: 1.35,0.4 1.6,0.15 1.7,0.15 1.7,1.05 1.6,1.05 1.35,0.8
  region: 0.4,-1.35 0.15,-1.6 0.15,-1.7 1.05,-1.7 1.05,-1.6 0.8,-1.35
  region: -0.8,-1.35 -1.05,-1.6 -1.05,-1.7 -0.15,-1.7 -0.15,-1.6 -0.4,-1.35
  region: 0.4,-0.15 0.15,-0.4 0.15,-0.8 0.4,-1.05 0.8,-1.05 1.05,-0.8 1.05,-0.4 0.8,-0.15
  region: -0.8,-0.15 -1.05,-0.4 -1.05,-0.8 -0.8,-1.05 -0.4,-1.05 -0.15,-0.8 -0.15,-0.4 -0.4,-0.15
  region: -0.8,1.05 -1.05,0.8 -1.05,0.4 -0.8,0.15 -0.4,0.15 -0.15,0.4 -0.15,0.8 -0.4,1.05
  region: 0.4,1.05 0.15,0.8 0.15,0.4 0.4,0.15 0.8,0.15 1.05,0.4 1.05,0.8 0.8,1.05
Top Solder:
  drawing of 1 lines, arcs and shapes, not listed
Mechanical 13:
  circle w0.127: c-1.75,1.75 r0.4
  lines w0.1: -2.5,-2.5 -2.5,2.5 2.5,2.5 2.5,-2.5 -2.5,-2.5
Mechanical 15:
  lines w0.102: -3.1,-3.1 3.1,-3.1 3.1,3.1 -3.1,3.1 -3.1,-3.1
3D body: height 0.91, standoff 0.9, extent -2.15,1.35 -1.35,2.15
3D body: height 0.9, standoff 0, extent -2.5,-2.5 2.5,2.5

## QFN48-1 [mm] "QFN48; 48 Leads; Body Width 7.0 mm; Pitch 0.5 mm"
height 0.8
pads (49):
  oval 0.7x0.25 smd mask+0.051: 1(-3.4,2.75) 2(-3.4,2.25) 3(-3.4,1.75) 4(-3.4,1.25) 5(-3.4,0.75) 6(-3.4,0.25) 7(-3.4,-0.25) 8(-3.4,-0.75) 9(-3.4,-1.25) 10(-3.4,-1.75) 11(-3.4,-2.25) 12(-3.4,-2.75) 25(3.4,-2.75) 26(3.4,-2.25) 27(3.4,-1.75) 28(3.4,-1.25) 29(3.4,-0.75) 30(3.4,-0.25) 31(3.4,0.25) 32(3.4,0.75) 33(3.4,1.25) 34(3.4,1.75) 35(3.4,2.25) 36(3.4,2.75)
  oval 0.25x0.7 smd mask+0.051: 13(-2.75,-3.4) 14(-2.25,-3.4) 15(-1.75,-3.4) 16(-1.25,-3.4) 17(-0.75,-3.4) 18(-0.25,-3.4) 19(0.25,-3.4) 20(0.75,-3.4) 21(1.25,-3.4) 22(1.75,-3.4) 23(2.25,-3.4) 24(2.75,-3.4) 37(2.75,3.4) 38(2.25,3.4) 39(1.75,3.4) 40(1.25,3.4) 41(0.75,3.4) 42(0.25,3.4) 43(-0.25,3.4) 44(-0.75,3.4) 45(-1.25,3.4) 46(-1.75,3.4) 47(-2.25,3.4) 48(-2.75,3.4)
  rect 5.1x5.1 smd paste-5 mask-5: 49(0,0)
via -1.8,1.8 diameter 0.6 hole 0.3
via -0.6,1.8 diameter 0.6 hole 0.3
via 0.6,1.8 diameter 0.6 hole 0.3
via 1.8,1.8 diameter 0.6 hole 0.3
via -1.8,0.6 diameter 0.6 hole 0.3
via -0.6,0.6 diameter 0.6 hole 0.3
via 0.6,0.6 diameter 0.6 hole 0.3
via 1.8,0.6 diameter 0.6 hole 0.3
via -1.8,-0.6 diameter 0.6 hole 0.3
via -0.6,-0.6 diameter 0.6 hole 0.3
via 0.6,-0.6 diameter 0.6 hole 0.3
via 1.8,-0.6 diameter 0.6 hole 0.3
via -1.8,-1.8 diameter 0.6 hole 0.3
via -0.6,-1.8 diameter 0.6 hole 0.3
via 0.6,-1.8 diameter 0.6 hole 0.3
via 1.8,-1.8 diameter 0.6 hole 0.3
Top Overlay:
  circle w0.25: c-4.25,2.75 r0.125
Top Paste:
  drawing of 25 lines, arcs and shapes, not listed
Top Solder:
  drawing of 1 lines, arcs and shapes, not listed
Mechanical 13:
  circle w0.1: c-2.55,2.55 r0.5
  lines w0.1: -3.5,-3.5 -3.5,3.5 3.5,3.5 3.5,-3.5 -3.5,-3.5
Mechanical 15:
  lines w0.1: -0.5,0 0.5,0 ; 0,-0.5 0,0.5 ; -4.1,-4.1 -4.1,4.1 4.1,4.1 4.1,-4.1 -4.1,-4.1
3D body: height 0.8, standoff 0.01, extent -3.5,-3.5 3.5,3.5

## QFN50P200X200X85_HS-9N [mm] "QFN, 8-Leads, Body 2.00x2.00mm, Pitch 0.50mm, Thermal Pad 0.60x1.20mm, IPC Medium Density"
height 0.85
pads (9):
  oval 0.55x0.25 smd mask+0.075: 1(-1.05,0.75) 2(-1.05,0.25) 3(-1.05,-0.25) 4(-1.05,-0.75) 5(1.05,-0.75) 6(1.05,-0.25) 7(1.05,0.25) 8(1.05,0.75)
  rect 0.6x1.2 smd: 9(0,0)
Top Overlay:
  circle w0.1: c-1.3,1.3 r0.05
Mechanical 13:
  circle w0.1: c-0.55,0.575 r0.2
  lines w0.1: -1,-1 -1,1 1,1 1,-1 -1,-1
Mechanical 15:
  lines w0.05: -1.575,-1.575 -1.575,1.575 1.575,1.575 1.575,-1.575 -1.575,-1.575
  lines w0.1: -0.5,0 0.5,0 ; 0,-0.5 0,0.5
3D body: height 0.86, standoff 0.85, extent -0.75,0.375 -0.35,0.775
3D body: height 0.85, standoff 0.05, extent -1,-1 1,1

## QFN50P250X300X80-8N [mm] "QFN, 8-Leads, Body 3,0x2,5mm (max), Pitch 0,50mm, IPC Medium Density"
height 0.8
pads (9):
  oval 0.35x0.6 smd mask+0.051: 1(-0.75,-1.55) 2(-0.25,-1.55) 3(0.25,-1.55) 4(0.75,-1.55) 5(0.75,1.55) 6(0.25,1.55) 7(-0.25,1.55) 8(-0.75,1.55)
  rect 1.5x1.7 smd paste-7 mask-7: 9(0,0)
via 0,0 diameter 0.7 hole 0.35
Top Overlay:
  circle w0.25: c-1.6,-1.55 r0.125
  lines w0.2: -1.575,-1.5 -1.25,-1.5 -1.25,-0.575 ; -1.575,1.5 -1.25,1.5 -1.25,0.575 ; 1.25,-0.575 1.25,-1.5 1.575,-1.5 ; 1.25,0.575 1.25,1.5 1.575,1.5
Top Paste:
  region: -0.75,0.85 -0.175,0.85 -0.175,0.3 -0.3,0.175 -0.75,0.175
  region: 0.75,0.85 0.175,0.85 0.175,0.3 0.3,0.175 0.75,0.175
  region: 0.75,-0.85 0.175,-0.85 0.175,-0.3 0.3,-0.175 0.75,-0.175
  region: -0.75,-0.85 -0.175,-0.85 -0.175,-0.3 -0.3,-0.175 -0.75,-0.175
Top Solder:
  circle w0.102: c0,0 r0.42
  region: -0.8,0.9 0.8,0.9 0.8,-0.9 0,-0.9 0,-0.4 0.178,-0.381 0.254,-0.33 0.305,-0.254 0.381,-0.152 0.406,-0.025 0.406,0.102 0.381,0.203 0.305,0.279 0.229,0.33 0.127,0.406 -0.178,0.406 -0.356,0.229 -0.381,0.102 -0.406,-0.051 -0.406,-0.152 -0.33,-0.254 -0.178,-0.356 -0.127,-0.406 0,-0.432 0,-0.9 -0.8,-0.9
Mechanical 13:
  circle w0.1: c-0.737,-0.864 r0.254
  lines w0.1: -1.25,-1.5 1.25,-1.5 1.25,1.5 -1.25,1.5 -1.25,-1.5
Mechanical 15:
  lines w0.1: -0.5,0 0.5,0 ; 0,-0.5 0,0.5 ; -1.85,-2.1 1.85,-2.1 1.85,2.1 -1.85,2.1 -1.85,-2.1
3D body: height 0.81, standoff 0.8, extent -0.991,-1.118 -0.483,-0.61
3D body: height 0.8, standoff 0.05, extent -1.25,-1.5 1.25,1.5

## QFN50P250X450X80-20N [mm] "QFN, 20-Leads, Body 4,5x2,5mm (max), Pitch 0,50mm, IPC Medium Density"
height 0.8
pads (21):
  oval 0.3x0.65 smd mask+0.051: 1(-0.25,2.275) 10(-0.25,-2.275) 11(0.25,-2.275) 20(0.25,2.275)
  oval 0.65x0.3 smd mask+0.051: 2(-1.275,1.75) 3(-1.275,1.25) 4(-1.275,0.75) 5(-1.275,0.25) 6(-1.275,-0.25) 7(-1.275,-0.75) 8(-1.275,-1.25) 9(-1.275,-1.75) 12(1.275,-1.75) 13(1.275,-1.25) 14(1.275,-0.75) 15(1.275,-0.25) 16(1.275,0.25) 17(1.275,0.75) 18(1.275,1.25) 19(1.275,1.75)
  rect 1.2x3.2 smd paste-5 mask-7: 21(0,0)
via 0,1.2 diameter 0.65 hole 0.3
via 0,0 diameter 0.65 hole 0.3
via 0,-1.2 diameter 0.65 hole 0.3
Top Overlay:
  circle w0.25: c-1.7,2.325 r0.125
  lines w0.2: -1.25,-2.55 -1.25,-2.25 -0.55,-2.25 ; -1.25,2.55 -1.25,2.25 -0.55,2.25 ; 0.55,-2.25 1.25,-2.25 1.25,-2.55 ; 0.55,2.25 1.25,2.25 1.25,2.55
Top Paste:
  region: -0.6,1.6 -0.225,1.6 -0.225,1.45 -0.325,1.35 -0.325,1.05 -0.15,0.875 -0.075,0.875 -0.075,0.325 -0.15,0.325 -0.325,0.15 -0.325,0.075 -0.6,0.075
  region: 0.6,1.6 0.225,1.6 0.225,1.45 0.325,1.35 0.325,1.05 0.15,0.875 0.075,0.875 0.075,0.325 0.15,0.325 0.325,0.15 0.325,0.075 0.6,0.075
  region: 0.6,-1.6 0.225,-1.6 0.225,-1.45 0.325,-1.35 0.325,-1.05 0.15,-0.875 0.075,-0.875 0.075,-0.325 0.15,-0.325 0.325,-0.15 0.325,-0.075 0.6,-0.075
  region: -0.6,-1.6 -0.225,-1.6 -0.225,-1.45 -0.325,-1.35 -0.325,-1.05 -0.15,-0.875 -0.075,-0.875 -0.075,-0.325 -0.15,-0.325 -0.325,-0.15 -0.325,-0.075 -0.6,-0.075
Top Solder:
  circle w0.1: c0,1.2 r0.38
  circle w0.1: c0,0 r0.38
  circle w0.1: c0,-1.2 r0.38
  region: 0,1.675 -0.675,1.675 -0.675,0.6 0.675,0.6 0.675,1.675 0,1.675 0,1.6 -0.175,1.575 -0.375,1.375 -0.375,1.025 -0.1,0.8 0,0.775 0.125,0.825 0.3,1 0.4,1.2 0.275,1.475 0,1.6
  region: 0,-1.675 -0.675,-1.675 -0.675,-0.6 0.675,-0.6 0.675,-1.675 0,-1.675 0,-1.6 -0.175,-1.575 -0.375,-1.375 -0.375,-1.025 -0.075,-0.825 0,-0.775 0.125,-0.825 0.3,-1 0.4,-1.2 0.275,-1.475 0,-1.6
  region: 0,-0.6 -0.675,-0.6 -0.675,0.6 0.675,0.6 0.675,-0.6 0,-0.6 0,-0.4 -0.175,-0.375 -0.375,-0.175 -0.375,0.175 -0.075,0.375 0,0.425 0.125,0.375 0.3,0.2 0.4,0 0.275,-0.275 0,-0.4
Mechanical 13:
  circle w0.1: c-0.625,1.65 r0.35
  lines w0.1: -1.25,-2.25 -1.25,2.25 1.25,2.25 1.25,-2.25 -1.25,-2.25
Mechanical 15:
  lines w0.1: -0.5,0 0.5,0 ; 0,-0.5 0,0.5 ; -1.85,-2.85 -1.85,2.85 1.85,2.85 1.85,-2.85 -1.85,-2.85
3D body: height 0.8, standoff 0.01, extent -1.25,-2.25 1.25,2.25
3D body: height 0.81, standoff 0.8, extent -0.972,1.301 -0.275,1.999

## QFN50P300X300X75-8N [mm] "QFN, 8-Leads, Body 3,0x3,0mm (max), Pitch 0,50mm, IPC Medium Density"
height 0.75
pads (9):
  oval 0.25x0.6 smd mask+0.051: 1(-0.75,-1.55) 2(-0.25,-1.55) 3(0.25,-1.55) 4(0.75,-1.55) 5(0.75,1.55) 6(0.25,1.55) 7(-0.25,1.55) 8(-0.75,1.55)
  rect 2.1x1.7 smd paste-7 mask-7: 9(0,0)
via -0.6,0 diameter 0.65 hole 0.3
via 0.6,0 diameter 0.65 hole 0.3
Top Overlay:
  circle w0.25: c-1.6,-1.55 r0.125
  lines w0.2: -1.525,-1.5 -1.5,-1.5 -1.5,-0.525 ; -1.525,1.5 -1.5,1.5 -1.5,0.525 ; 1.5,-0.525 1.5,-1.5 1.525,-1.5 ; 1.5,0.525 1.5,1.5 1.525,1.5
Top Paste:
  region: -0.279,0.127 -0.61,0.457 -1.041,0.457 -1.041,0.838 1.041,0.838 1.041,0.457 0.61,0.457 0.279,0.127
  region: -0.279,-0.127 -0.61,-0.457 -1.041,-0.457 -1.041,-0.838 1.041,-0.838 1.041,-0.457 0.61,-0.457 0.279,-0.127
Top Solder:
  circle w0.102: c-0.6,0 r0.406
  circle w0.102: c0.6,0 r0.406
  region: -1.168,0.965 0,0.965 0,-0.965 -1.168,-0.965 -1.168,0 -1.016,0 -0.991,-0.152 -0.914,-0.229 -0.864,-0.33 -0.711,-0.381 -0.533,-0.406 -0.406,-0.381 -0.305,-0.305 -0.229,-0.178 -0.194,0 -0.229,0.127 -0.305,0.254 -0.432,0.381 -0.61,0.406 -0.737,0.356 -0.889,0.279 -0.991,0.127 -1.016,0.025 -1.016,0 -1.168,0
  region: 1.168,0.965 0,0.965 0,-0.965 1.168,-0.965 1.168,0 1.016,0 0.991,-0.152 0.914,-0.229 0.864,-0.33 0.711,-0.381 0.533,-0.406 0.406,-0.381 0.305,-0.305 0.229,-0.178 0.194,0 0.229,0.127 0.305,0.254 0.432,0.381 0.61,0.406 0.737,0.356 0.889,0.279 0.991,0.127 1.016,0.025 1.016,0 1.168,0
Mechanical 13:
  lines w0.1: -1.5,-1.5 -1.5,1.5 1.5,1.5 1.5,-1.5 -1.5,-1.5
Mechanical 15:
  lines w0.1: -0.5,0 0.5,0 ; 0,-0.5 0,0.5 ; -2.1,-2.1 -2.1,2.1 2.1,2.1 2.1,-2.1 -2.1,-2.1
3D body: height 0.75, standoff 0.05, extent -1.5,-1.5 1.5,1.5
3D body: height 0.76, standoff 0.75, extent -1.035,-1.143 -0.438,-0.544